# Altium footprint library XU-GENARAL PCB .PcbLib: 1176 footprints (part 8 of 75)
Each footprint in its own frame and in the unit in brackets; x right, y up, seen from the top. Pads: shape width x height; smd on the part's side, far side on the other; paste and mask are expansions set on the pad; w line width, h text height; cw(c..) or ccw(c..) is an arc to the next point about the centre after c.
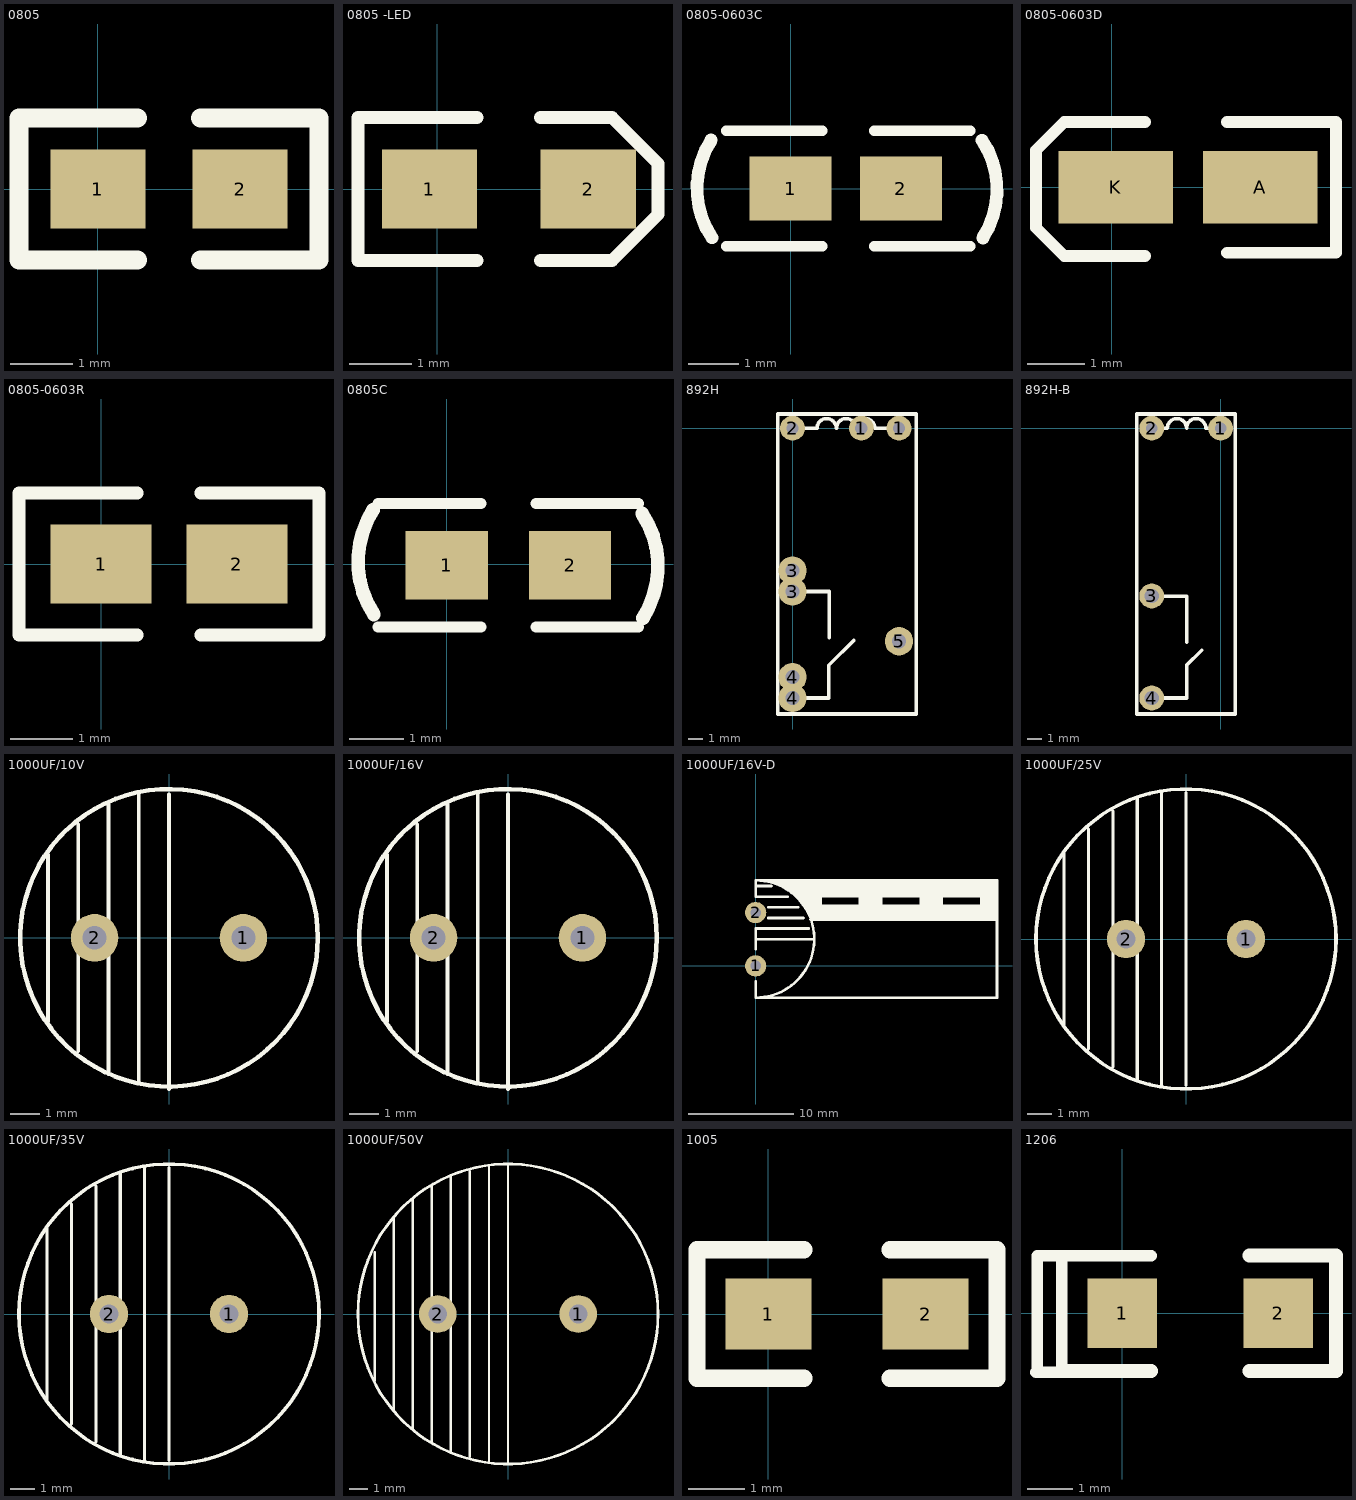
[diagram p7: the footprints below, top view; thin cyan lines are the x and y axes]

## 0805 [mil]
pads (2):
  rect 60x50 smd: 1(0,0) 2(90,0)
Top Overlay:
  lines w12: 25,-45 -50,-45 -50,45 25,45 ; 65,-45 140,-45 140,45 65,45

## 0805 -LED [mil]
pads (2):
  rect 60x50 smd: 1(-5,0) 2(95,0)
Top Overlay:
  lines w8: 25,-45 -50,-45 -50,45 25,45 ; 65,-45 109,-45 ; 65,45 110,45 139,16 139,-16 110,-45

## 0805-0603C [mil]
pads (2):
  rect 64x50 smd: 1(0,0) 2(86,0)
Top Overlay:
  lines w8: -50,-45 25,-45 ; -50,45 25,45 ; 65,-45 140,-45 ; 65,45 140,45
  lines w10: -61.85,37.76 ccw(c-2.98,0.12) -61.27,-38.4 ; 149.3,37.65 cw(c91.02,-0.88) 149.88,-38.51

## 0805-0603D [mm]
pads (2):
  rect 2x1.27 smd: A(2.6,0) K(0.075,0)
Top Overlay:
  lines w0.203: 0.584,-1.2 -0.825,-1.2 -1.321,-0.704 -1.321,0.647 -0.825,1.143 0.584,1.143 ; 2.016,-1.143 3.921,-1.143 3.921,1.143 2.016,1.143

## 0805-0603R [mil]
pads (2):
  rect 64x50 smd: 1(0,0) 2(86,0)
Top Overlay:
  lines w8: 23,-45 -52,-45 -52,45 23,45 ; 63,-45 138,-45 138,45 63,45

## 0805C [mil]
pads (2):
  rect 60x50 smd: 1(-0.23,-0.61) 2(89.77,-0.61)
Top Overlay:
  lines w8: -50.23,-45.61 24.77,-45.61 ; -50.23,44.39 24.77,44.39 ; 64.77,-45.61 139.77,-45.61 ; 64.77,44.39 139.77,44.39
  lines w10: -53.87,39.64 ccw(c5,2) -53.29,-36.53 ; 142.29,37.04 cw(c84,-1.49) 142.87,-39.12

## 892H [mil]
pads (8):
  round 70 hole 35: 1(194,0) 1(300,0) 2(0,0)
  round 80 hole 40: 3(0,-460) 3(0,-401) 4(0,-760) 4(0,-701) 5(300,-600)
Top Overlay:
  lines w10: -2,0 69,0 cw(c96,0) 123,0 ; 3,-760 102,-760 102,-668 173,-597 ; 3,-460 103,-460 103,-590 ; 124,0 cw(c151,0) 178,0 cw(c205,0) 232,0 300,0 ; -42,-805 -42,40 349,40 349,-805 -42,-805

## 892H-B [mil]
pads (4):
  round 70 hole 32: 1(0,0) 2(-194,0)
  round 70 hole 40: 3(-194,-472.44) 4(-194,-760)
Top Overlay:
  lines w10: -221,0 -150,0 cw(c-123,0) -96,0 cw(c-69,0) -42,0 26,0 ; -196,-473 -96,-473 -96,-603 ; -195,-760 -96,-760 -96,-668 -53,-625 ; -236,-805 41,-805 41,40 -236,40 -236,-805

## 1000UF/10V [mm]
pads (2):
  round 1.6 hole 0.8: 1(2.5,0) 2(-2.5,0)
Top Overlay:
  circle w0.152: c0,0 r5
  rectangle: -2.032,-2.032 -2.032,2.032
  lines w0.127: -4.064,-2.794 -4.064,2.794 ; -3.048,-3.81 -3.048,3.81 ; -2.032,-4.572 -2.032,4.572 ; -1.016,-4.826 -1.016,4.826 ; 0,-5.08 0,4.826

## 1000UF/16V [mm]
pads (2):
  round 1.6 hole 0.8: 1(2.5,0) 2(-2.5,0)
Top Overlay:
  circle w0.152: c0,0 r5
  rectangle: -2.032,-2.032 -2.032,2.032
  lines w0.127: -4.064,-2.794 -4.064,2.794 ; -3.048,-3.81 -3.048,3.81 ; -2.032,-4.572 -2.032,4.572 ; -1.016,-4.826 -1.016,4.826 ; 0,-5.08 0,4.826

## 1000UF/16V-D [mil]
pads (2):
  round 80 hole 40: 1(0,0) 2(0,200)
Top Overlay:
  rectangle: 196.85,188.98 205.71,195.87
  rectangle: 205.71,188.98 210.63,198.82
  rectangle: 188.98,207.68 204.72,224.41
  rectangle: 181.1,222.44 196.85,235.24
  rectangle: 170.28,233.27 192.91,240.16
  rectangle: 161.42,248.03 173.23,259.84
  rectangle: 153.54,255.91 172.24,269.69
  rectangle: 136.81,269.69 153.54,280.51
  rectangle: 125,278.54 151.57,288.39
  rectangle: 111.22,288.39 125,299.21
  rectangle: 91.53,296.26 121.06,311.02
  rectangle: 79.72,304.13 88.58,320.91
  rectangle: 85.63,304.13 88.58,320.91
  rectangle: 63.98,309.06 69.88,320.91
  rectangle: 69.88,309.06 102.36,320.91
  rectangle: 102.36,304.13 123.03,309.06
  rectangle: 85.63,304.13 123.03,320.91
  rectangle: 115.16,286.42 161.42,320.91
  rectangle: 205.71,174.21 219.49,182.09
  rectangle: 205.71,182.09 223.43,198.82
  rectangle: 196.85,195.87 223.43,222.44
  rectangle: 186.02,216.53 228.35,245.08
  rectangle: 170.28,240.16 221.46,267.72
  rectangle: 148.62,261.81 227.36,320.91
  rectangle: 218.5,217.52 241.14,262.8
  rectangle: 389.76,225.39 471.46,280.51
  rectangle: 620.08,213.58 697.84,277.56
  rectangle: 848.42,213.58 905.51,271.65
  rectangle: 218.5,262.8 905.51,320.91
  rectangle: 218.5,174.21 905.51,225.39
  lines w10: 0,-58.07 0,-119.09 ; 0,62.99 0,140 199.68,140 ; 0,100 219.68,100 ; 0,300 59.68,300 ; 0,319.88 0,260 119.68,260 ; 47.24,180 179.68,180 ; 47.24,220 159.68,220 ; 205.71,174.21 896.65,174.21 ; 905.51,319.88 905.51,-119.09 0,-119.09 ; 905.51,320.91 0,320.91 cw(c0,100.91) 0,-119.09 ; 243.11,225.39 390.75,225.39 390.75,261.81 243.11,261.81 243.11,225.39 ; 471.46,225.39 619.09,225.39 619.09,261.81 471.46,261.81 471.46,225.39 ; 698.82,225.39 846.46,225.39 846.46,261.81 698.82,261.81 698.82,225.39

## 1000UF/25V [mm]
pads (2):
  round 1.6 hole 0.8: 1(2.5,0) 2(-2.5,0)
Top Overlay:
  circle w0.152: c0,0 r6.25
  rectangle: -2.032,-2.032 -2.032,2.032
  lines w0.127: -5.08,-3.556 -5.08,3.556 ; -4.064,-4.572 -4.064,4.572 ; -4.064,-2.794 -4.064,2.794 ; -3.048,-5.334 -3.048,5.334 ; -3.048,-3.81 -3.048,3.81 ; -2.032,-5.842 -2.032,5.842 ; -2.032,-4.572 -2.032,4.572 ; -1.016,-6.096 -1.016,6.096 ; -1.016,-4.826 -1.016,4.826 ; 0,-6.096 0,6.096 ; 0,-5.08 0,4.826

## 1000UF/35V [mm]
pads (2):
  round 1.6 hole 0.8: 1(2.5,0) 2(-2.5,0)
Top Overlay:
  circle w0.152: c0,0 r6.25
  rectangle: -2.032,-2.032 -2.032,2.032
  lines w0.127: -5.08,-3.556 -5.08,3.556 ; -4.064,-4.572 -4.064,4.572 ; -4.064,-2.794 -4.064,2.794 ; -3.048,-5.334 -3.048,5.334 ; -3.048,-3.81 -3.048,3.81 ; -2.032,-5.842 -2.032,5.842 ; -2.032,-4.572 -2.032,4.572 ; -1.016,-6.096 -1.016,6.096 ; -1.016,-4.826 -1.016,4.826 ; 0,-6.096 0,6.096 ; 0,-5.08 0,4.826

## 1000UF/50V [mm]
pads (2):
  round 2 hole 1: 1(3.75,0) 2(-3.75,0)
Top Overlay:
  circle w0.152: c0,0 r8
  rectangle: -2.032,-2.032 -2.032,2.032
  lines w0.127: -7.112,-3.556 -7.112,3.302 ; -6.096,-5.08 -6.096,5.08 ; -5.08,-6.096 -5.08,6.096 ; -4.064,-6.858 -4.064,6.858 ; -3.048,-7.366 -3.048,7.366 ; -2.032,-7.62 -2.032,7.62 ; -1.016,-7.874 -1.016,7.874 ; 0,-7.874 0,7.874 ; 0,-5.08 0,4.826

## 1005 [mil]
pads (2):
  rect 60x50 smd: 1(0,0) 2(110,0)
Top Overlay:
  lines w12: 25,-45 -50,-45 -50,45 25,45 ; 85,-45 160,-45 160,45 85,45

## 1206 [mil]
pads (2):
  rect 60x60 smd: 1(0,0) 2(135,0)
Top Overlay:
  lines w10: -52.36,-47.64 -52.36,50 -50,50 ; -50,-50 -51.18,-51.18 -74.8,-51.18 -73.62,-50 -73.62,50 -50,50 ; 25,50 -50,50
  lines w12: -50,-50 25,-50 ; 110,-50 185,-50 185,50 110,50